# Altium footprint library CD's_LIB_2018.PcbLib: 155 footprints (part 4 of 10)
Each footprint in its own frame and in the unit in brackets; x right, y up, seen from the top. Pads: shape width x height; smd on the part's side, far side on the other; paste and mask are expansions set on the pad; w line width, h text height; cw(c..) or ccw(c..) is an arc to the next point about the centre after c.
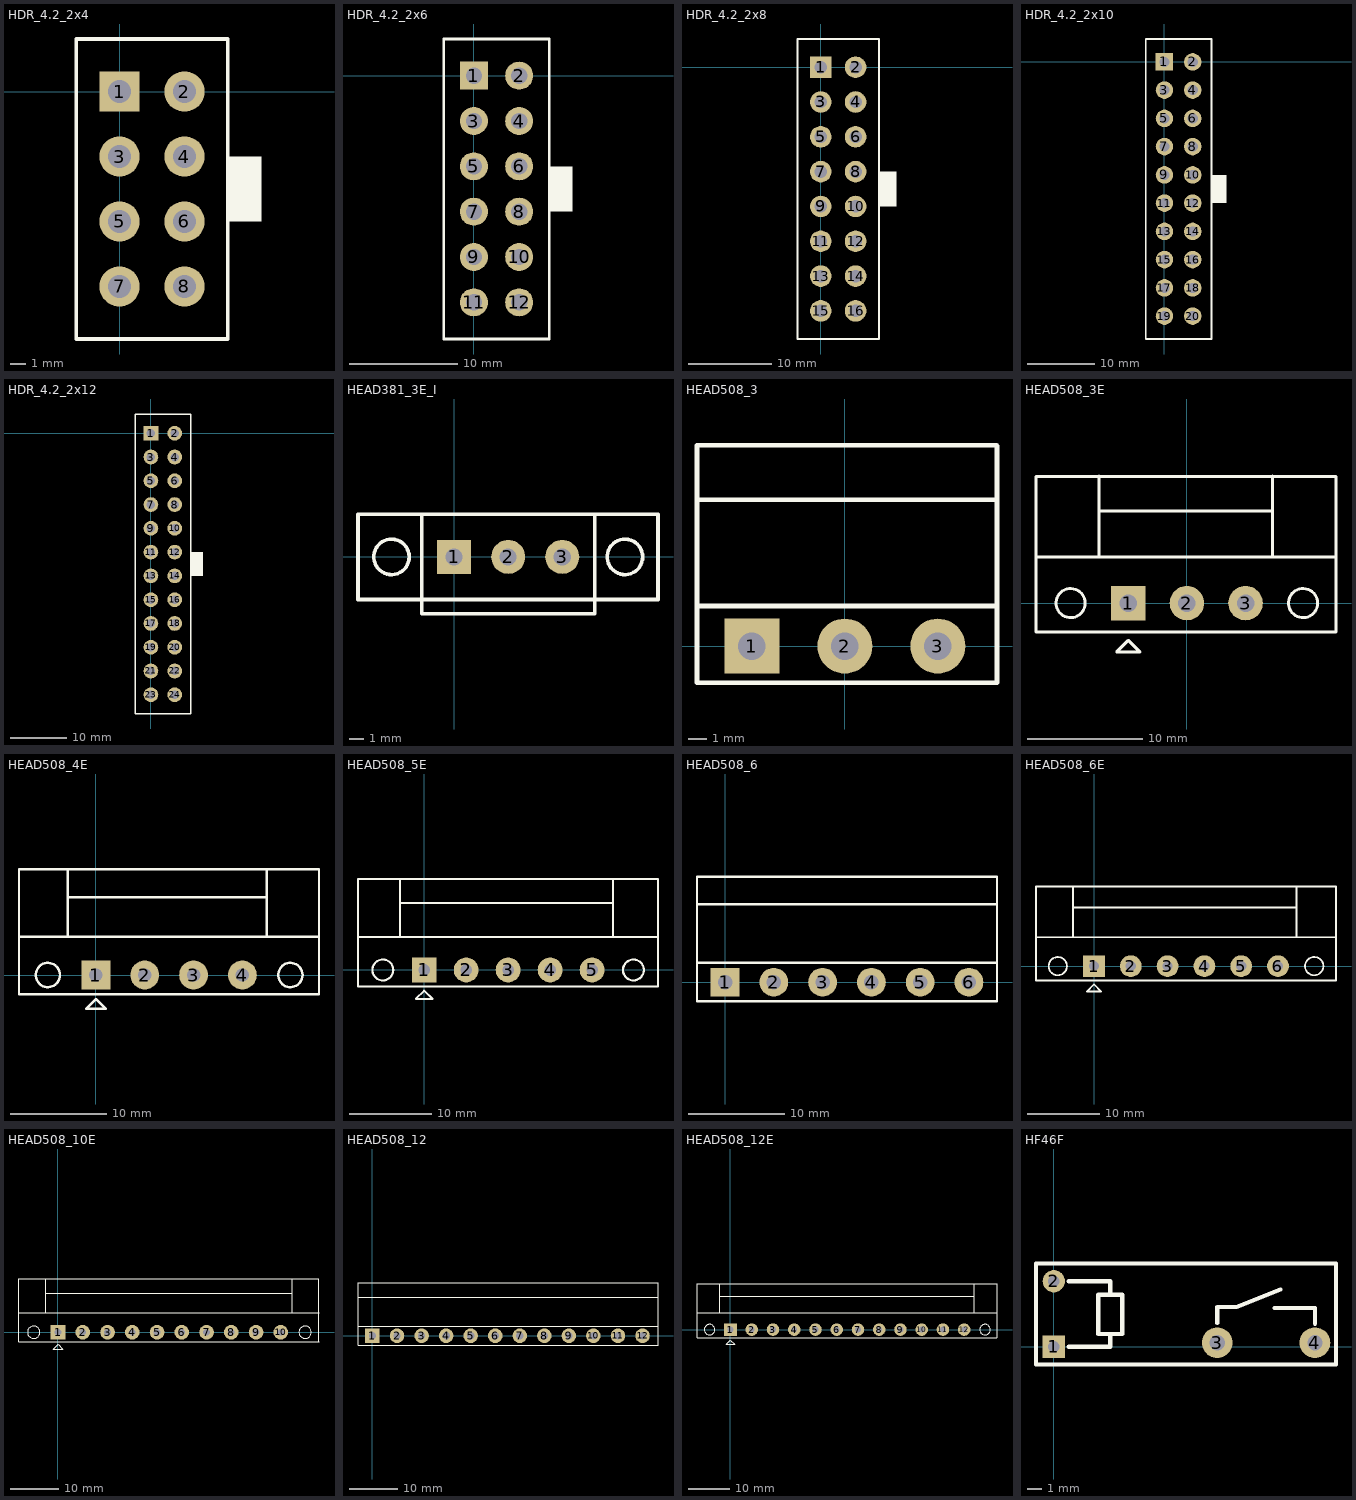
[diagram p3: the footprints below, top view; thin cyan lines are the x and y axes]

## HDR_4.2_2x4 [mm]
pads (8):
  rect 2.6x2.6 hole 1.5: 1(0,0)
  round 2.6 hole 1.5: 2(4.2,0) 3(0,-4.2) 4(4.2,-4.2) 5(0,-8.4) 6(4.2,-8.4) 7(0,-12.6) 8(4.2,-12.6)
Top Overlay:
  rectangle: 7.096,-8.4 9.196,-4.2
  lines w0.25: -2.8,-16 -2.8,3.4 7,3.4 7,-16 -2.8,-16

## HDR_4.2_2x6 [mm]
pads (12):
  rect 2.6x2.6 hole 1.5: 1(0,0)
  round 2.6 hole 1.5: 2(4.2,0) 3(0,-4.2) 4(4.2,-4.2) 5(0,-8.4) 6(4.2,-8.4) 7(0,-12.6) 8(4.2,-12.6) 9(0,-16.8) 10(4.2,-16.8) 11(0,-21) 12(4.2,-21)
Top Overlay:
  rectangle: 7.028,-12.6 9.128,-8.4
  lines w0.25: -2.8,-24.4 -2.8,3.4 7,3.4 7,-24.4 -2.8,-24.4

## HDR_4.2_2x8 [mm]
pads (16):
  rect 2.6x2.6 hole 1.5: 1(0,0)
  round 2.6 hole 1.5: 2(4.2,0) 3(0,-4.2) 4(4.2,-4.2) 5(0,-8.4) 6(4.2,-8.4) 7(0,-12.6) 8(4.2,-12.6) 9(0,-16.8) 10(4.2,-16.8) 11(0,-21) 12(4.2,-21) 13(0,-25.2) 14(4.2,-25.2) 15(0,-29.4) 16(4.2,-29.4)
Top Overlay:
  rectangle: 7.028,-16.8 9.128,-12.6
  lines w0.25: -2.8,-32.791 -2.8,3.4 7,3.4 7,-32.791 -2.8,-32.791

## HDR_4.2_2x10 [mm]
pads (20):
  rect 2.6x2.6 hole 1.5: 1(0,0)
  round 2.6 hole 1.5: 2(4.2,0) 3(0,-4.2) 4(4.2,-4.2) 5(0,-8.4) 6(4.2,-8.4) 7(0,-12.6) 8(4.2,-12.6) 9(0,-16.8) 10(4.2,-16.8) 11(0,-21) 12(4.2,-21) 13(0,-25.2) 14(4.2,-25.2) 15(0,-29.4) 16(4.2,-29.4) 17(0,-33.6) 18(4.2,-33.6) 19(0,-37.8) 20(4.2,-37.8)
Top Overlay:
  rectangle: 7.096,-21 9.196,-16.8
  lines w0.25: -2.8,-41.2 7,-41.2 7,3.4 -2.8,3.4 -2.8,-41.2

## HDR_4.2_2x12 [mm]
pads (24):
  rect 2.6x2.6 hole 1.5: 1(0,0)
  round 2.6 hole 1.5: 2(4.2,0) 3(0,-4.2) 4(4.2,-4.2) 5(0,-8.4) 6(4.2,-8.4) 7(0,-12.6) 8(4.2,-12.6) 9(0,-16.8) 10(4.2,-16.8) 11(0,-21) 12(4.2,-21) 13(0,-25.2) 14(4.2,-25.2) 15(0,-29.4) 16(4.2,-29.4) 17(0,-33.6) 18(4.2,-33.6) 19(0,-37.8) 20(4.2,-37.8) 21(0,-42) 22(4.2,-42) 23(0,-46.2) 24(4.2,-46.2)
Top Overlay:
  rectangle: 7.096,-25.2 9.196,-21
  lines w0.25: -2.8,-49.6 7,-49.6 7,3.4 -2.8,3.4 -2.8,-49.6

## HEAD381_3E_I [mm] "3.81带锁直立"
pads (3):
  rect 2.4x2.4 hole 1.2: 1(0,0)
  round 2.4 hole 1.2: 2(3.81,0) 3(7.62,0)
Top Overlay:
  circle w0.254: c12.04,0 r1.25
  circle w0.254: c-4.42,0 r1.25
  lines w0.254: -2.388,-3.003 9.92,-3.003 14.371,-3.003 14.371,2.997 9.92,2.997 ; -2.331,-3.003 -6.782,-3.003 -6.782,2.997 -2.3,2.997 ; -2.3,2.997 9.92,2.997 ; -2.3,2.997 -2.3,-4.003 9.92,-4.003 9.92,2.997

## HEAD508_3 [mm]
pads (3):
  rect 3x3 hole 1.5: 1(-5.08,0)
  round 3 hole 1.5: 2(0,0) 3(5.08,0)
Top Overlay:
  lines w0.254: -8.082,2.184 8.28,2.184 ; -8.08,8.001 8.306,8.001 ; 8.306,10.968 -8.082,10.968 -8.082,-2.002 8.311,-2.002 8.311,10.952
3D body: height 8.6, standoff -3.5, extent -7.62,-1.995 7.62,10.008

## HEAD508_3E [mm]
pads (3):
  rect 3x3 hole 1.524: 1(-5.069,0.001)
  round 3 hole 1.524: 2(0.011,0.001) 3(5.091,0.001)
Top Overlay:
  circle w0.254: c-10.069,0.001 r1.262
  circle w0.254: c10.078,0.001 r1.262
  lines w0.254: -13.07,3.989 12.93,3.989 ; -7.609,3.989 -7.609,11.001 ; -7.572,7.989 7.442,7.989 ; 7.439,3.977 7.439,11.001 ; 12.93,3.989 12.93,-2.5 -13.06,-2.5 -13.06,10.989 12.93,10.989 12.93,3.989 ; -6.069,-4.225 -5.069,-3.225 -4.069,-4.225 -6.069,-4.225

## HEAD508_4E [mm]
pads (4):
  rect 3x3 hole 1.4: 1(0,0)
  round 3 hole 1.4: 2(5.08,0) 3(10.16,0) 4(15.24,0)
Top Overlay:
  circle w0.254: c-5,0 r1.262
  circle w0.254: c20.24,0 r1.262
  lines w0.254: -8.008,10.998 -8.008,-1.988 23.216,-1.988 23.216,10.998 ; -8.001,3.988 23.216,3.988 ; -8.001,10.998 23.19,10.998 ; -2.921,4.039 -2.921,11 ; -2.921,8.103 17.78,8.103 ; 17.78,3.988 17.78,10.922 ; -1,-3.504 1,-3.504 0,-2.504 -1,-3.504

## HEAD508_5E [mm]
pads (5):
  rect 3x3 hole 1.4: 1(0,0)
  round 3 hole 1.4: 2(5.08,0) 3(10.16,0) 4(15.24,0) 5(20.32,0)
Top Overlay:
  circle w0.254: c25.32,0 r1.262
  circle w0.254: c-5,0 r1.262
  lines w0.254: -8.008,10.998 -8.008,-1.988 28.296,-1.988 28.296,10.998 -8.001,10.998 ; -8.001,3.988 28.245,3.988 ; -2.921,4.039 -2.921,11 ; -2.921,8.103 22.86,8.103 ; 22.86,3.988 22.86,10.922 ; -1,-3.504 0,-2.504 1,-3.504 -1,-3.504

## HEAD508_6 [mm]
pads (6):
  rect 3x3 hole 1.5: 1(0,0)
  round 3 hole 1.5: 2(5.08,0) 3(10.16,0) 4(15.24,0) 5(20.32,0) 6(25.4,0)
Top Overlay:
  lines w0.254: -2.921,2.007 28.321,2.007 ; -2.921,8.103 28.321,8.103 ; -2.921,-2 28.321,-2 28.321,11 -2.921,11 -2.921,-2

## HEAD508_6E [mm]
pads (6):
  rect 3x3 hole 1.4: 1(0,0)
  round 3 hole 1.4: 2(5.08,0) 3(10.16,0) 4(15.24,0) 5(20.32,0) 6(25.4,0)
Top Overlay:
  circle w0.254: c30.4,0 r1.262
  circle w0.254: c-5,0 r1.262
  lines w0.254: -8.008,10.998 -8.008,-1.988 33.401,-1.988 ; -8.001,10.998 33.376,10.998 ; -7.925,3.988 33.325,3.988 ; -2.921,4.039 -2.921,11 ; -2.921,8.103 27.94,8.103 ; 27.94,3.988 27.94,10.922 ; 33.408,-1.93 33.408,10.998 ; -1,-3.504 0,-2.504 1,-3.504 -1,-3.504

## HEAD508_10E [mm]
pads (10):
  rect 3x3 hole 1.4: 1(0.008,-0.012)
  round 3 hole 1.4: 2(5.088,-0.012) 3(10.168,-0.012) 4(15.248,-0.012) 5(20.328,-0.012) 6(25.408,-0.012) 7(30.488,-0.012) 8(35.568,-0.012) 9(40.648,-0.012) 10(45.728,-0.012)
Top Overlay:
  circle w0.254: c50.714,-0.012 r1.262
  circle w0.254: c-4.992,-0.012 r1.262
  lines w0.254: -7.993,3.976 18.007,3.976 53.569,3.976 ; -2.532,3.976 -2.532,10.988 ; -2.492,7.987 48.076,7.987 ; 48.076,3.965 48.076,10.988 ; 53.543,10.987 -8,10.987 -8,-2 53.569,-2 ; 53.567,-2 53.567,10.971 ; -0.992,-3.515 1.008,-3.515 0.008,-2.515 -0.992,-3.515

## HEAD508_12 [mm]
pads (12):
  rect 3x3 hole 1.5: 1(0,0)
  round 3 hole 1.5: 2(5.08,0) 3(10.16,0) 4(15.24,0) 5(20.32,0) 6(25.4,0) 7(30.48,0) 8(35.56,0) 9(40.64,0) 10(45.72,0) 11(50.8,0) 12(55.88,0)
Top Overlay:
  lines w0.254: -3,2.007 59.08,2.007 ; -3,8.001 59.08,8.001 ; -3,-2 -3,11 59.08,11 59.08,-2 -3,-2

## HEAD508_12E [mm]
pads (12):
  rect 3x3 hole 1.4: 1(0.008,-0.012)
  round 3 hole 1.4: 2(5.088,-0.012) 3(10.168,-0.012) 4(15.248,-0.012) 5(20.328,-0.012) 6(25.408,-0.012) 7(30.488,-0.012) 8(35.568,-0.012) 9(40.648,-0.012) 10(45.728,-0.012) 11(50.808,-0.012) 12(55.888,-0.012)
Top Overlay:
  circle w0.254: c-4.992,-0.012 r1.262
  circle w0.254: c60.874,-0.012 r1.262
  lines w0.254: -8.001,10.987 63.711,10.987 ; -8,3.976 63.727,3.976 ; -8,10.986 -8,-2 63.72,-2 ; -2.532,3.976 -2.532,10.988 ; -2.5,7.987 58.236,7.987 ; 58.236,3.965 58.236,10.988 ; 63.727,-2 63.727,10.971 ; -0.992,-3.515 1.008,-3.515 0.008,-2.515 -0.992,-3.515

## HF46F [mm] "薄继电器"
pads (4):
  rect 1.6x1.6 hole 0.8: 1(0,0)
  round 1.6 hole 0.8: 2(0,4.7)
  round 2.2 hole 1.1: 3(11.7,0.3) 4(18.7,0.3)
Top Overlay:
  lines w0.3: 1.067,0 4.039,0 4.039,0.813 ; 1.067,4.7 4.039,4.7 4.039,3.81 ; 11.7,1.702 11.7,2.845 13.081,2.845 16.231,4.115 ; 15.799,2.769 18.7,2.769 18.7,1.651 ; -1.277,-1.277 -1.277,5.977 20.209,5.977 20.209,-1.277 -1.277,-1.277 ; 3.175,0.914 4.902,0.914 4.902,3.734 3.175,3.734 3.175,0.914